# Altium footprint library altera-stratix-iv.PCBLIB: 5 footprints (part 4 of 4)
Each footprint in its own frame and in the unit in brackets; x right, y up, seen from the top. Pads: shape width x height; smd on the part's side, far side on the other; paste and mask are expansions set on the pad; w line width, h text height; cw(c..) or ccw(c..) is an arc to the next point about the centre after c.
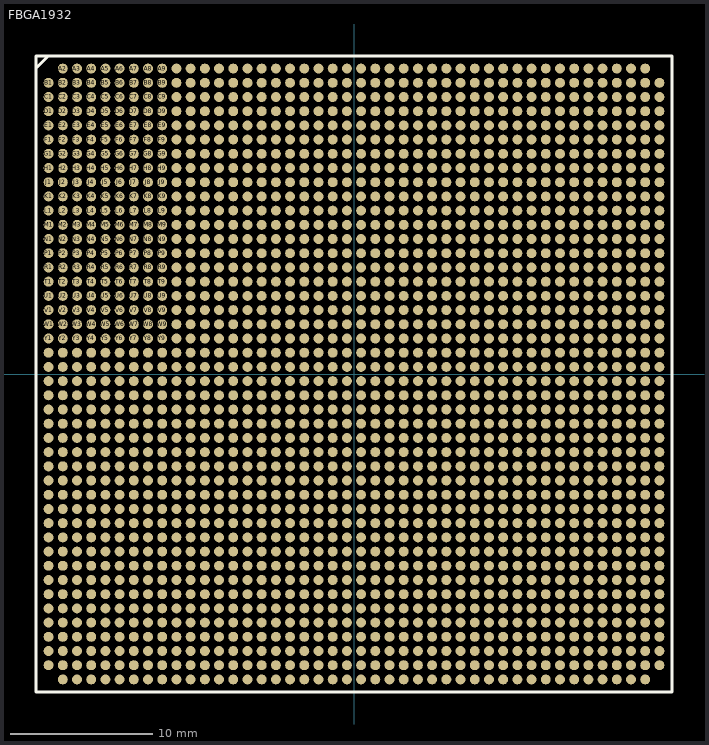
[diagram p3: the footprint, top view; thin cyan lines are the x and y axes]

## FBGA1932 [mil]
pads (1932):
  rrect100% 27.56x27.56 smd: A2(-807.09,846.46) A3(-767.72,846.46) A4(-728.35,846.46) A5(-688.98,846.46) A6(-649.61,846.46) A7(-610.24,846.46) A8(-570.87,846.46) A9(-531.5,846.46) A10(-492.13,846.46) A11(-452.76,846.46) A12(-413.39,846.46) A13(-374.02,846.46) A14(-334.65,846.46) A15(-295.28,846.46) A16(-255.91,846.46) A17(-216.54,846.46) A18(-177.17,846.46) A19(-137.8,846.46) A20(-98.43,846.46) A21(-59.06,846.46) A22(-19.69,846.46) A23(19.69,846.46) A24(59.06,846.46) A25(98.43,846.46) A26(137.8,846.46) A27(177.17,846.46) A28(216.54,846.46) A29(255.91,846.46) A30(295.28,846.46) A31(334.65,846.46) A32(374.02,846.46) A33(413.39,846.46) A34(452.76,846.46) A35(492.13,846.46) A36(531.5,846.46) A37(570.87,846.46) A38(610.24,846.46) A39(649.61,846.46) A40(688.98,846.46) A41(728.35,846.46) A42(767.72,846.46) A43(807.09,846.46) AA1(-846.46,59.06) AA2(-807.09,59.06) AA3(-767.72,59.06) AA4(-728.35,59.06) AA5(-688.98,59.06) AA6(-649.61,59.06) AA7(-610.24,59.06) AA8(-570.87,59.06) AA9(-531.5,59.06) AA10(-492.13,59.06) AA11(-452.76,59.06) AA12(-413.39,59.06) AA13(-374.02,59.06) AA14(-334.65,59.06) AA15(-295.28,59.06) AA16(-255.91,59.06) AA17(-216.54,59.06) AA18(-177.17,59.06) AA19(-137.8,59.06) AA20(-98.43,59.06) AA21(-59.06,59.06) AA22(-19.69,59.06) AA23(19.69,59.06) AA24(59.06,59.06) AA25(98.43,59.06) AA26(137.8,59.06) AA27(177.17,59.06) AA28(216.54,59.06) AA29(255.91,59.06) AA30(295.28,59.06) AA31(334.65,59.06) AA32(374.02,59.06) AA33(413.39,59.06) AA34(452.76,59.06) AA35(492.13,59.06) AA36(531.5,59.06) AA37(570.87,59.06) AA38(610.24,59.06) AA39(649.61,59.06) AA40(688.98,59.06) AA41(728.35,59.06) AA42(767.72,59.06) AA43(807.09,59.06) AA44(846.46,59.06) AB1(-846.46,19.69) AB2(-807.09,19.69) AB3(-767.72,19.69) AB4(-728.35,19.69) AB5(-688.98,19.69) AB6(-649.61,19.69) AB7(-610.24,19.69) AB8(-570.87,19.69) AB9(-531.5,19.69) AB10(-492.13,19.69) AB11(-452.76,19.69) AB12(-413.39,19.69) AB13(-374.02,19.69) AB14(-334.65,19.69) AB15(-295.28,19.69) AB16(-255.91,19.69) AB17(-216.54,19.69) AB18(-177.17,19.69) AB19(-137.8,19.69) AB20(-98.43,19.69) AB21(-59.06,19.69) AB22(-19.69,19.69) AB23(19.69,19.69) AB24(59.06,19.69) AB25(98.43,19.69) AB26(137.8,19.69) AB27(177.17,19.69) AB28(216.54,19.69) AB29(255.91,19.69) AB30(295.28,19.69) AB31(334.65,19.69) AB32(374.02,19.69) AB33(413.39,19.69) AB34(452.76,19.69) AB35(492.13,19.69) AB36(531.5,19.69) AB37(570.87,19.69) AB38(610.24,19.69) AB39(649.61,19.69) AB40(688.98,19.69) AB41(728.35,19.69) AB42(767.72,19.69) AB43(807.09,19.69) AB44(846.46,19.69) AC1(-846.46,-19.69) AC2(-807.09,-19.69) AC3(-767.72,-19.69) AC4(-728.35,-19.69) AC5(-688.98,-19.69) AC6(-649.61,-19.69) AC7(-610.24,-19.69) AC8(-570.87,-19.69) AC9(-531.5,-19.69) AC10(-492.13,-19.69) AC11(-452.76,-19.69) AC12(-413.39,-19.69) AC13(-374.02,-19.69) AC14(-334.65,-19.69) AC15(-295.28,-19.69) AC16(-255.91,-19.69) AC17(-216.54,-19.69) AC18(-177.17,-19.69) AC19(-137.8,-19.69) AC20(-98.43,-19.69) AC21(-59.06,-19.69) AC22(-19.69,-19.69) AC23(19.69,-19.69) AC24(59.06,-19.69) AC25(98.43,-19.69) AC26(137.8,-19.69) AC27(177.17,-19.69) AC28(216.54,-19.69) AC29(255.91,-19.69) AC30(295.28,-19.69) AC31(334.65,-19.69) AC32(374.02,-19.69) AC33(413.39,-19.69) AC34(452.76,-19.69) AC35(492.13,-19.69) AC36(531.5,-19.69) AC37(570.87,-19.69) AC38(610.24,-19.69) AC39(649.61,-19.69) AC40(688.98,-19.69) AC41(728.35,-19.69) AC42(767.72,-19.69) AC43(807.09,-19.69) AC44(846.46,-19.69) AD1(-846.46,-59.06) AD2(-807.09,-59.06) AD3(-767.72,-59.06) AD4(-728.35,-59.06) AD5(-688.98,-59.06) AD6(-649.61,-59.06) AD7(-610.24,-59.06) AD8(-570.87,-59.06) AD9(-531.5,-59.06) AD10(-492.13,-59.06) AD11(-452.76,-59.06) AD12(-413.39,-59.06) AD13(-374.02,-59.06) AD14(-334.65,-59.06) AD15(-295.28,-59.06) AD16(-255.91,-59.06) AD17(-216.54,-59.06) AD18(-177.17,-59.06) AD19(-137.8,-59.06) AD20(-98.43,-59.06) AD21(-59.06,-59.06) AD22(-19.69,-59.06) AD23(19.69,-59.06) AD24(59.06,-59.06) AD25(98.43,-59.06) AD26(137.8,-59.06) AD27(177.17,-59.06) AD28(216.54,-59.06) AD29(255.91,-59.06) AD30(295.28,-59.06) AD31(334.65,-59.06) AD32(374.02,-59.06) AD33(413.39,-59.06) AD34(452.76,-59.06) AD35(492.13,-59.06) AD36(531.5,-59.06) AD37(570.87,-59.06) AD38(610.24,-59.06) AD39(649.61,-59.06) AD40(688.98,-59.06) AD41(728.35,-59.06) AD42(767.72,-59.06) AD43(807.09,-59.06) AD44(846.46,-59.06) AE1(-846.46,-98.43) AE2(-807.09,-98.43) AE3(-767.72,-98.43) AE4(-728.35,-98.43) AE5(-688.98,-98.43) AE6(-649.61,-98.43) AE7(-610.24,-98.43) AE8(-570.87,-98.43) AE9(-531.5,-98.43) AE10(-492.13,-98.43) AE11(-452.76,-98.43) AE12(-413.39,-98.43) AE13(-374.02,-98.43) AE14(-334.65,-98.43) AE15(-295.28,-98.43) AE16(-255.91,-98.43) AE17(-216.54,-98.43) AE18(-177.17,-98.43) AE19(-137.8,-98.43) AE20(-98.43,-98.43) AE21(-59.06,-98.43) AE22(-19.69,-98.43) AE23(19.69,-98.43) AE24(59.06,-98.43) AE25(98.43,-98.43) AE26(137.8,-98.43) AE27(177.17,-98.43) AE28(216.54,-98.43) AE29(255.91,-98.43) AE30(295.28,-98.43) AE31(334.65,-98.43) AE32(374.02,-98.43) AE33(413.39,-98.43) AE34(452.76,-98.43) AE35(492.13,-98.43) AE36(531.5,-98.43) AE37(570.87,-98.43) AE38(610.24,-98.43) AE39(649.61,-98.43) AE40(688.98,-98.43) AE41(728.35,-98.43) AE42(767.72,-98.43) AE43(807.09,-98.43) AE44(846.46,-98.43) AF1(-846.46,-137.8) AF2(-807.09,-137.8) AF3(-767.72,-137.8) AF4(-728.35,-137.8) AF5(-688.98,-137.8) AF6(-649.61,-137.8) AF7(-610.24,-137.8) AF8(-570.87,-137.8) AF9(-531.5,-137.8) AF10(-492.13,-137.8) AF11(-452.76,-137.8) AF12(-413.39,-137.8) AF13(-374.02,-137.8) AF14(-334.65,-137.8) AF15(-295.28,-137.8) AF16(-255.91,-137.8) AF17(-216.54,-137.8) AF18(-177.17,-137.8) AF19(-137.8,-137.8) AF20(-98.43,-137.8) AF21(-59.06,-137.8) AF22(-19.69,-137.8) AF23(19.69,-137.8) AF24(59.06,-137.8) AF25(98.43,-137.8) AF26(137.8,-137.8) AF27(177.17,-137.8) AF28(216.54,-137.8) AF29(255.91,-137.8) AF30(295.28,-137.8) AF31(334.65,-137.8) AF32(374.02,-137.8) AF33(413.39,-137.8) AF34(452.76,-137.8) AF35(492.13,-137.8) AF36(531.5,-137.8) AF37(570.87,-137.8) AF38(610.24,-137.8) AF39(649.61,-137.8) AF40(688.98,-137.8) AF41(728.35,-137.8) AF42(767.72,-137.8) AF43(807.09,-137.8) AF44(846.46,-137.8) AG1(-846.46,-177.17) AG2(-807.09,-177.17) AG3(-767.72,-177.17) AG4(-728.35,-177.17) AG5(-688.98,-177.17) AG6(-649.61,-177.17) AG7(-610.24,-177.17) AG8(-570.87,-177.17) AG9(-531.5,-177.17) AG10(-492.13,-177.17) AG11(-452.76,-177.17) AG12(-413.39,-177.17) AG13(-374.02,-177.17) AG14(-334.65,-177.17) AG15(-295.28,-177.17) AG16(-255.91,-177.17) AG17(-216.54,-177.17) AG18(-177.17,-177.17) AG19(-137.8,-177.17) AG20(-98.43,-177.17) AG21(-59.06,-177.17) AG22(-19.69,-177.17) AG23(19.69,-177.17) AG24(59.06,-177.17) AG25(98.43,-177.17) AG26(137.8,-177.17) AG27(177.17,-177.17) AG28(216.54,-177.17) AG29(255.91,-177.17) AG30(295.28,-177.17) AG31(334.65,-177.17) AG32(374.02,-177.17) AG33(413.39,-177.17) AG34(452.76,-177.17) AG35(492.13,-177.17) AG36(531.5,-177.17) AG37(570.87,-177.17) AG38(610.24,-177.17) AG39(649.61,-177.17) AG40(688.98,-177.17) AG41(728.35,-177.17) AG42(767.72,-177.17) AG43(807.09,-177.17) AG44(846.46,-177.17) AH1(-846.46,-216.54) AH2(-807.09,-216.54) AH3(-767.72,-216.54) AH4(-728.35,-216.54) AH5(-688.98,-216.54) AH6(-649.61,-216.54) AH7(-610.24,-216.54) AH8(-570.87,-216.54) AH9(-531.5,-216.54) AH10(-492.13,-216.54) AH11(-452.76,-216.54) AH12(-413.39,-216.54) AH13(-374.02,-216.54) AH14(-334.65,-216.54) AH15(-295.28,-216.54) AH16(-255.91,-216.54) AH17(-216.54,-216.54) AH18(-177.17,-216.54) AH19(-137.8,-216.54) AH20(-98.43,-216.54) AH21(-59.06,-216.54) AH22(-19.69,-216.54) AH23(19.69,-216.54) AH24(59.06,-216.54) AH25(98.43,-216.54) AH26(137.8,-216.54) AH27(177.17,-216.54) AH28(216.54,-216.54) AH29(255.91,-216.54) AH30(295.28,-216.54) AH31(334.65,-216.54) AH32(374.02,-216.54) AH33(413.39,-216.54) AH34(452.76,-216.54) AH35(492.13,-216.54) AH36(531.5,-216.54) AH37(570.87,-216.54) AH38(610.24,-216.54) AH39(649.61,-216.54) AH40(688.98,-216.54) AH41(728.35,-216.54) AH42(767.72,-216.54) AH43(807.09,-216.54) AH44(846.46,-216.54) AJ1(-846.46,-255.91) AJ2(-807.09,-255.91) AJ3(-767.72,-255.91) AJ4(-728.35,-255.91) AJ5(-688.98,-255.91) AJ6(-649.61,-255.91) AJ7(-610.24,-255.91) AJ8(-570.87,-255.91) AJ9(-531.5,-255.91) AJ10(-492.13,-255.91) AJ11(-452.76,-255.91) AJ12(-413.39,-255.91) AJ13(-374.02,-255.91) AJ14(-334.65,-255.91) AJ15(-295.28,-255.91) AJ16(-255.91,-255.91) AJ17(-216.54,-255.91) AJ18(-177.17,-255.91) AJ19(-137.8,-255.91) AJ20(-98.43,-255.91) AJ21(-59.06,-255.91) AJ22(-19.69,-255.91) AJ23(19.69,-255.91) AJ24(59.06,-255.91) AJ25(98.43,-255.91) AJ26(137.8,-255.91) AJ27(177.17,-255.91) AJ28(216.54,-255.91) AJ29(255.91,-255.91) AJ30(295.28,-255.91) AJ31(334.65,-255.91) AJ32(374.02,-255.91) AJ33(413.39,-255.91) AJ34(452.76,-255.91) AJ35(492.13,-255.91) AJ36(531.5,-255.91) AJ37(570.87,-255.91) AJ38(610.24,-255.91) AJ39(649.61,-255.91) AJ40(688.98,-255.91) AJ41(728.35,-255.91) AJ42(767.72,-255.91) AJ43(807.09,-255.91) AJ44(846.46,-255.91) AK1(-846.46,-295.28) AK2(-807.09,-295.28) AK3(-767.72,-295.28) AK4(-728.35,-295.28) AK5(-688.98,-295.28) AK6(-649.61,-295.28) AK7(-610.24,-295.28) AK8(-570.87,-295.28) AK9(-531.5,-295.28) AK10(-492.13,-295.28) AK11(-452.76,-295.28) AK12(-413.39,-295.28) AK13(-374.02,-295.28) AK14(-334.65,-295.28) AK15(-295.28,-295.28) AK16(-255.91,-295.28) AK17(-216.54,-295.28) AK18(-177.17,-295.28) AK19(-137.8,-295.28) AK20(-98.43,-295.28) AK21(-59.06,-295.28) AK22(-19.69,-295.28) AK23(19.69,-295.28) AK24(59.06,-295.28) AK25(98.43,-295.28) AK26(137.8,-295.28) AK27(177.17,-295.28) AK28(216.54,-295.28) AK29(255.91,-295.28) AK30(295.28,-295.28) AK31(334.65,-295.28) AK32(374.02,-295.28) AK33(413.39,-295.28) AK34(452.76,-295.28) AK35(492.13,-295.28) AK36(531.5,-295.28) AK37(570.87,-295.28) AK38(610.24,-295.28) AK39(649.61,-295.28) AK40(688.98,-295.28) AK41(728.35,-295.28) AK42(767.72,-295.28) AK43(807.09,-295.28) AK44(846.46,-295.28) AL1(-846.46,-334.65) AL2(-807.09,-334.65) AL3(-767.72,-334.65) AL4(-728.35,-334.65) AL5(-688.98,-334.65) AL6(-649.61,-334.65) AL7(-610.24,-334.65) AL8(-570.87,-334.65) AL9(-531.5,-334.65) AL10(-492.13,-334.65) AL11(-452.76,-334.65) AL12(-413.39,-334.65) AL13(-374.02,-334.65) AL14(-334.65,-334.65) AL15(-295.28,-334.65) AL16(-255.91,-334.65) AL17(-216.54,-334.65) AL18(-177.17,-334.65) AL19(-137.8,-334.65) AL20(-98.43,-334.65) AL21(-59.06,-334.65) AL22(-19.69,-334.65) AL23(19.69,-334.65) AL24(59.06,-334.65) AL25(98.43,-334.65) AL26(137.8,-334.65) AL27(177.17,-334.65) AL28(216.54,-334.65) AL29(255.91,-334.65) AL30(295.28,-334.65) AL31(334.65,-334.65) AL32(374.02,-334.65) AL33(413.39,-334.65) AL34(452.76,-334.65) AL35(492.13,-334.65) AL36(531.5,-334.65) AL37(570.87,-334.65) AL38(610.24,-334.65) AL39(649.61,-334.65) AL40(688.98,-334.65) AL41(728.35,-334.65) AL42(767.72,-334.65) AL43(807.09,-334.65) AL44(846.46,-334.65) AM1(-846.46,-374.02) AM2(-807.09,-374.02) AM3(-767.72,-374.02) AM4(-728.35,-374.02) AM5(-688.98,-374.02) AM6(-649.61,-374.02) AM7(-610.24,-374.02) AM8(-570.87,-374.02) AM9(-531.5,-374.02) AM10(-492.13,-374.02) AM11(-452.76,-374.02) AM12(-413.39,-374.02) AM13(-374.02,-374.02) AM14(-334.65,-374.02) AM15(-295.28,-374.02) AM16(-255.91,-374.02) AM17(-216.54,-374.02) AM18(-177.17,-374.02) AM19(-137.8,-374.02) AM20(-98.43,-374.02) AM21(-59.06,-374.02) AM22(-19.69,-374.02) AM23(19.69,-374.02) AM24(59.06,-374.02) AM25(98.43,-374.02) AM26(137.8,-374.02) AM27(177.17,-374.02) AM28(216.54,-374.02) AM29(255.91,-374.02) AM30(295.28,-374.02) AM31(334.65,-374.02) AM32(374.02,-374.02) AM33(413.39,-374.02) AM34(452.76,-374.02) AM35(492.13,-374.02) AM36(531.5,-374.02) AM37(570.87,-374.02) AM38(610.24,-374.02) AM39(649.61,-374.02) AM40(688.98,-374.02) AM41(728.35,-374.02) AM42(767.72,-374.02) AM43(807.09,-374.02) AM44(846.46,-374.02) AN1(-846.46,-413.39) AN2(-807.09,-413.39) AN3(-767.72,-413.39) AN4(-728.35,-413.39) AN5(-688.98,-413.39) AN6(-649.61,-413.39) AN7(-610.24,-413.39) AN8(-570.87,-413.39) AN9(-531.5,-413.39) AN10(-492.13,-413.39) AN11(-452.76,-413.39) AN12(-413.39,-413.39) AN13(-374.02,-413.39) AN14(-334.65,-413.39) AN15(-295.28,-413.39) AN16(-255.91,-413.39) AN17(-216.54,-413.39) AN18(-177.17,-413.39) AN19(-137.8,-413.39) AN20(-98.43,-413.39) AN21(-59.06,-413.39) AN22(-19.69,-413.39) AN23(19.69,-413.39) AN24(59.06,-413.39) AN25(98.43,-413.39) AN26(137.8,-413.39) AN27(177.17,-413.39) AN28(216.54,-413.39) AN29(255.91,-413.39) AN30(295.28,-413.39) AN31(334.65,-413.39) AN32(374.02,-413.39) AN33(413.39,-413.39) AN34(452.76,-413.39) AN35(492.13,-413.39) AN36(531.5,-413.39) AN37(570.87,-413.39) AN38(610.24,-413.39) AN39(649.61,-413.39) AN40(688.98,-413.39) AN41(728.35,-413.39) AN42(767.72,-413.39) AN43(807.09,-413.39) AN44(846.46,-413.39) AP1(-846.46,-452.76) AP2(-807.09,-452.76) AP3(-767.72,-452.76) AP4(-728.35,-452.76) AP5(-688.98,-452.76) AP6(-649.61,-452.76) AP7(-610.24,-452.76) AP8(-570.87,-452.76) AP9(-531.5,-452.76) AP10(-492.13,-452.76) AP11(-452.76,-452.76) AP12(-413.39,-452.76) AP13(-374.02,-452.76) AP14(-334.65,-452.76) AP15(-295.28,-452.76) AP16(-255.91,-452.76) AP17(-216.54,-452.76) AP18(-177.17,-452.76) AP19(-137.8,-452.76) AP20(-98.43,-452.76) AP21(-59.06,-452.76) AP22(-19.69,-452.76) AP23(19.69,-452.76) AP24(59.06,-452.76) AP25(98.43,-452.76) AP26(137.8,-452.76) AP27(177.17,-452.76) AP28(216.54,-452.76) AP29(255.91,-452.76) AP30(295.28,-452.76) AP31(334.65,-452.76) AP32(374.02,-452.76) AP33(413.39,-452.76) AP34(452.76,-452.76) AP35(492.13,-452.76) AP36(531.5,-452.76) AP37(570.87,-452.76) AP38(610.24,-452.76) AP39(649.61,-452.76) AP40(688.98,-452.76) AP41(728.35,-452.76) AP42(767.72,-452.76) AP43(807.09,-452.76) AP44(846.46,-452.76) AR1(-846.46,-492.13) AR2(-807.09,-492.13) AR3(-767.72,-492.13) AR4(-728.35,-492.13) AR5(-688.98,-492.13) AR6(-649.61,-492.13) AR7(-610.24,-492.13) AR8(-570.87,-492.13) AR9(-531.5,-492.13) AR10(-492.13,-492.13) AR11(-452.76,-492.13) AR12(-413.39,-492.13) AR13(-374.02,-492.13) AR14(-334.65,-492.13) AR15(-295.28,-492.13) AR16(-255.91,-492.13) AR17(-216.54,-492.13) AR18(-177.17,-492.13) AR19(-137.8,-492.13) AR20(-98.43,-492.13) AR21(-59.06,-492.13) AR22(-19.69,-492.13) AR23(19.69,-492.13) AR24(59.06,-492.13) AR25(98.43,-492.13) AR26(137.8,-492.13) AR27(177.17,-492.13) AR28(216.54,-492.13) AR29(255.91,-492.13) AR30(295.28,-492.13) AR31(334.65,-492.13) AR32(374.02,-492.13) AR33(413.39,-492.13) AR34(452.76,-492.13) AR35(492.13,-492.13) AR36(531.5,-492.13) AR37(570.87,-492.13) AR38(610.24,-492.13) AR39(649.61,-492.13) AR40(688.98,-492.13) AR41(728.35,-492.13) AR42(767.72,-492.13) AR43(807.09,-492.13) AR44(846.46,-492.13) AT1(-846.46,-531.5) AT2(-807.09,-531.5) AT3(-767.72,-531.5) AT4(-728.35,-531.5) AT5(-688.98,-531.5) AT6(-649.61,-531.5) AT7(-610.24,-531.5) AT8(-570.87,-531.5) AT9(-531.5,-531.5) AT10(-492.13,-531.5) AT11(-452.76,-531.5) AT12(-413.39,-531.5) AT13(-374.02,-531.5) AT14(-334.65,-531.5) AT15(-295.28,-531.5) AT16(-255.91,-531.5) AT17(-216.54,-531.5) AT18(-177.17,-531.5) AT19(-137.8,-531.5) AT20(-98.43,-531.5) AT21(-59.06,-531.5) AT22(-19.69,-531.5) AT23(19.69,-531.5) AT24(59.06,-531.5) AT25(98.43,-531.5) AT26(137.8,-531.5) AT27(177.17,-531.5) AT28(216.54,-531.5) AT29(255.91,-531.5) AT30(295.28,-531.5) AT31(334.65,-531.5) AT32(374.02,-531.5) AT33(413.39,-531.5) AT34(452.76,-531.5) AT35(492.13,-531.5) AT36(531.5,-531.5) AT37(570.87,-531.5) AT38(610.24,-531.5) AT39(649.61,-531.5) AT40(688.98,-531.5) AT41(728.35,-531.5) AT42(767.72,-531.5) AT43(807.09,-531.5) AT44(846.46,-531.5) AU1(-846.46,-570.87) AU2(-807.09,-570.87) AU3(-767.72,-570.87) AU4(-728.35,-570.87) AU5(-688.98,-570.87) AU6(-649.61,-570.87) AU7(-610.24,-570.87) AU8(-570.87,-570.87) AU9(-531.5,-570.87) AU10(-492.13,-570.87) AU11(-452.76,-570.87) AU12(-413.39,-570.87) AU13(-374.02,-570.87) AU14(-334.65,-570.87) AU15(-295.28,-570.87) AU16(-255.91,-570.87) AU17(-216.54,-570.87) AU18(-177.17,-570.87) AU19(-137.8,-570.87) AU20(-98.43,-570.87) AU21(-59.06,-570.87) AU22(-19.69,-570.87) AU23(19.69,-570.87) AU24(59.06,-570.87) AU25(98.43,-570.87) AU26(137.8,-570.87) AU27(177.17,-570.87) AU28(216.54,-570.87) AU29(255.91,-570.87) AU30(295.28,-570.87) AU31(334.65,-570.87) AU32(374.02,-570.87) AU33(413.39,-570.87) AU34(452.76,-570.87) AU35(492.13,-570.87) AU36(531.5,-570.87) AU37(570.87,-570.87) AU38(610.24,-570.87) AU39(649.61,-570.87) AU40(688.98,-570.87) AU41(728.35,-570.87) AU42(767.72,-570.87) AU43(807.09,-570.87) AU44(846.46,-570.87) AV1(-846.46,-610.24) AV2(-807.09,-610.24) AV3(-767.72,-610.24) AV4(-728.35,-610.24) AV5(-688.98,-610.24) AV6(-649.61,-610.24) AV7(-610.24,-610.24) AV8(-570.87,-610.24) AV9(-531.5,-610.24) AV10(-492.13,-610.24) AV11(-452.76,-610.24) AV12(-413.39,-610.24) AV13(-374.02,-610.24) AV14(-334.65,-610.24) AV15(-295.28,-610.24) AV16(-255.91,-610.24) AV17(-216.54,-610.24) AV18(-177.17,-610.24) AV19(-137.8,-610.24) AV20(-98.43,-610.24) AV21(-59.06,-610.24) AV22(-19.69,-610.24) AV23(19.69,-610.24) AV24(59.06,-610.24) AV25(98.43,-610.24) AV26(137.8,-610.24) AV27(177.17,-610.24) AV28(216.54,-610.24) AV29(255.91,-610.24) AV30(295.28,-610.24) AV31(334.65,-610.24) AV32(374.02,-610.24) AV33(413.39,-610.24) AV34(452.76,-610.24) AV35(492.13,-610.24) AV36(531.5,-610.24) AV37(570.87,-610.24) AV38(610.24,-610.24) AV39(649.61,-610.24) AV40(688.98,-610.24) AV41(728.35,-610.24) AV42(767.72,-610.24) AV43(807.09,-610.24) AV44(846.46,-610.24) AW1(-846.46,-649.61) AW2(-807.09,-649.61) AW3(-767.72,-649.61) AW4(-728.35,-649.61) AW5(-688.98,-649.61) AW6(-649.61,-649.61) AW7(-610.24,-649.61) AW8(-570.87,-649.61) AW9(-531.5,-649.61) AW10(-492.13,-649.61) AW11(-452.76,-649.61) AW12(-413.39,-649.61) AW13(-374.02,-649.61) AW14(-334.65,-649.61) AW15(-295.28,-649.61) AW16(-255.91,-649.61) AW17(-216.54,-649.61) AW18(-177.17,-649.61) AW19(-137.8,-649.61) AW20(-98.43,-649.61) AW21(-59.06,-649.61) AW22(-19.69,-649.61) AW23(19.69,-649.61) AW24(59.06,-649.61) AW25(98.43,-649.61) AW26(137.8,-649.61) AW27(177.17,-649.61) AW28(216.54,-649.61) AW29(255.91,-649.61) AW30(295.28,-649.61) AW31(334.65,-649.61) AW32(374.02,-649.61) AW33(413.39,-649.61) AW34(452.76,-649.61) AW35(492.13,-649.61) AW36(531.5,-649.61) AW37(570.87,-649.61) AW38(610.24,-649.61) AW39(649.61,-649.61) AW40(688.98,-649.61) AW41(728.35,-649.61) AW42(767.72,-649.61) AW43(807.09,-649.61) AW44(846.46,-649.61) AY1(-846.46,-688.98) AY2(-807.09,-688.98) AY3(-767.72,-688.98) AY4(-728.35,-688.98) AY5(-688.98,-688.98) AY6(-649.61,-688.98) AY7(-610.24,-688.98) AY8(-570.87,-688.98) AY9(-531.5,-688.98) AY10(-492.13,-688.98) AY11(-452.76,-688.98) AY12(-413.39,-688.98) AY13(-374.02,-688.98) AY14(-334.65,-688.98) AY15(-295.28,-688.98) AY16(-255.91,-688.98) AY17(-216.54,-688.98) AY18(-177.17,-688.98) AY19(-137.8,-688.98) AY20(-98.43,-688.98) AY21(-59.06,-688.98) AY22(-19.69,-688.98) AY23(19.69,-688.98) AY24(59.06,-688.98) AY25(98.43,-688.98) AY26(137.8,-688.98) AY27(177.17,-688.98) AY28(216.54,-688.98) AY29(255.91,-688.98) AY30(295.28,-688.98) AY31(334.65,-688.98) AY32(374.02,-688.98) AY33(413.39,-688.98) AY34(452.76,-688.98) AY35(492.13,-688.98) AY36(531.5,-688.98) AY37(570.87,-688.98) AY38(610.24,-688.98) AY39(649.61,-688.98) AY40(688.98,-688.98) AY41(728.35,-688.98) AY42(767.72,-688.98) AY43(807.09,-688.98) AY44(846.46,-688.98) B1(-846.46,807.09) B2(-807.09,807.09) B3(-767.72,807.09) B4(-728.35,807.09) B5(-688.98,807.09) B6(-649.61,807.09) B7(-610.24,807.09) B8(-570.87,807.09) B9(-531.5,807.09) B10(-492.13,807.09) B11(-452.76,807.09) B12(-413.39,807.09) B13(-374.02,807.09) B14(-334.65,807.09) B15(-295.28,807.09) B16(-255.91,807.09) B17(-216.54,807.09) B18(-177.17,807.09) B19(-137.8,807.09) B20(-98.43,807.09) B21(-59.06,807.09) B22(-19.69,807.09) B23(19.69,807.09) B24(59.06,807.09) B25(98.43,807.09) B26(137.8,807.09) B27(177.17,807.09) B28(216.54,807.09) B29(255.91,807.09) B30(295.28,807.09) B31(334.65,807.09) B32(374.02,807.09) B33(413.39,807.09) B34(452.76,807.09) B35(492.13,807.09) B36(531.5,807.09) B37(570.87,807.09) B38(610.24,807.09) B39(649.61,807.09) B40(688.98,807.09) B41(728.35,807.09) B42(767.72,807.09) B43(807.09,807.09) B44(846.46,807.09) BA1(-846.46,-728.35) BA2(-807.09,-728.35) BA3(-767.72,-728.35) BA4(-728.35,-728.35) BA5(-688.98,-728.35) BA6(-649.61,-728.35) BA7(-610.24,-728.35) BA8(-570.87,-728.35) BA9(-531.5,-728.35) BA10(-492.13,-728.35) BA11(-452.76,-728.35) BA12(-413.39,-728.35) BA13(-374.02,-728.35) BA14(-334.65,-728.35) BA15(-295.28,-728.35) BA16(-255.91,-728.35) BA17(-216.54,-728.35) BA18(-177.17,-728.35) BA19(-137.8,-728.35) BA20(-98.43,-728.35) BA21(-59.06,-728.35) BA22(-19.69,-728.35) BA23(19.69,-728.35) BA24(59.06,-728.35) BA25(98.43,-728.35) BA26(137.8,-728.35) BA27(177.17,-728.35) BA28(216.54,-728.35) BA29(255.91,-728.35) BA30(295.28,-728.35) BA31(334.65,-728.35) BA32(374.02,-728.35) BA33(413.39,-728.35) BA34(452.76,-728.35) BA35(492.13,-728.35) BA36(531.5,-728.35) BA37(570.87,-728.35) BA38(610.24,-728.35) BA39(649.61,-728.35) BA40(688.98,-728.35) BA41(728.35,-728.35) BA42(767.72,-728.35) BA43(807.09,-728.35) BA44(846.46,-728.35) BB1(-846.46,-767.72) BB2(-807.09,-767.72) BB3(-767.72,-767.72) BB4(-728.35,-767.72) BB5(-688.98,-767.72) BB6(-649.61,-767.72) BB7(-610.24,-767.72) BB8(-570.87,-767.72) BB9(-531.5,-767.72) BB10(-492.13,-767.72) BB11(-452.76,-767.72) BB12(-413.39,-767.72) BB13(-374.02,-767.72) BB14(-334.65,-767.72) BB15(-295.28,-767.72) BB16(-255.91,-767.72) BB17(-216.54,-767.72) BB18(-177.17,-767.72) BB19(-137.8,-767.72) BB20(-98.43,-767.72) BB21(-59.06,-767.72) BB22(-19.69,-767.72) BB23(19.69,-767.72) BB24(59.06,-767.72) BB25(98.43,-767.72) BB26(137.8,-767.72) BB27(177.17,-767.72) BB28(216.54,-767.72) BB29(255.91,-767.72) BB30(295.28,-767.72) BB31(334.65,-767.72) BB32(374.02,-767.72) BB33(413.39,-767.72) BB34(452.76,-767.72) BB35(492.13,-767.72) BB36(531.5,-767.72) BB37(570.87,-767.72) BB38(610.24,-767.72) BB39(649.61,-767.72) BB40(688.98,-767.72) BB41(728.35,-767.72) BB42(767.72,-767.72) BB43(807.09,-767.72) BB44(846.46,-767.72) BC1(-846.46,-807.09) BC2(-807.09,-807.09) BC3(-767.72,-807.09) BC4(-728.35,-807.09) BC5(-688.98,-807.09) BC6(-649.61,-807.09) BC7(-610.24,-807.09) BC8(-570.87,-807.09) BC9(-531.5,-807.09) BC10(-492.13,-807.09) BC11(-452.76,-807.09) BC12(-413.39,-807.09) BC13(-374.02,-807.09) BC14(-334.65,-807.09) BC15(-295.28,-807.09) BC16(-255.91,-807.09) BC17(-216.54,-807.09) BC18(-177.17,-807.09) BC19(-137.8,-807.09) BC20(-98.43,-807.09) BC21(-59.06,-807.09) BC22(-19.69,-807.09) BC23(19.69,-807.09) BC24(59.06,-807.09) BC25(98.43,-807.09) BC26(137.8,-807.09) BC27(177.17,-807.09) BC28(216.54,-807.09) BC29(255.91,-807.09) BC30(295.28,-807.09) BC31(334.65,-807.09) BC32(374.02,-807.09) BC33(413.39,-807.09) BC34(452.76,-807.09) BC35(492.13,-807.09) BC36(531.5,-807.09) BC37(570.87,-807.09) BC38(610.24,-807.09) BC39(649.61,-807.09) BC40(688.98,-807.09) BC41(728.35,-807.09) BC42(767.72,-807.09) BC43(807.09,-807.09) BC44(846.46,-807.09) BD2(-807.09,-846.46) BD3(-767.72,-846.46) BD4(-728.35,-846.46) BD5(-688.98,-846.46) BD6(-649.61,-846.46) BD7(-610.24,-846.46) BD8(-570.87,-846.46) BD9(-531.5,-846.46) BD10(-492.13,-846.46) BD11(-452.76,-846.46) BD12(-413.39,-846.46) BD13(-374.02,-846.46) BD14(-334.65,-846.46) BD15(-295.28,-846.46) BD16(-255.91,-846.46) BD17(-216.54,-846.46) BD18(-177.17,-846.46) BD19(-137.8,-846.46) BD20(-98.43,-846.46) BD21(-59.06,-846.46) BD22(-19.69,-846.46) BD23(19.69,-846.46) BD24(59.06,-846.46) BD25(98.43,-846.46) BD26(137.8,-846.46) BD27(177.17,-846.46) BD28(216.54,-846.46) BD29(255.91,-846.46) BD30(295.28,-846.46) BD31(334.65,-846.46) BD32(374.02,-846.46) BD33(413.39,-846.46) BD34(452.76,-846.46) BD35(492.13,-846.46) BD36(531.5,-846.46) BD37(570.87,-846.46) BD38(610.24,-846.46) BD39(649.61,-846.46) BD40(688.98,-846.46) BD41(728.35,-846.46) BD42(767.72,-846.46) BD43(807.09,-846.46) C1(-846.46,767.72) C2(-807.09,767.72) C3(-767.72,767.72) C4(-728.35,767.72) C5(-688.98,767.72) C6(-649.61,767.72) C7(-610.24,767.72) C8(-570.87,767.72) C9(-531.5,767.72) C10(-492.13,767.72) C11(-452.76,767.72) C12(-413.39,767.72) C13(-374.02,767.72) C14(-334.65,767.72) C15(-295.28,767.72) C16(-255.91,767.72) C17(-216.54,767.72) C18(-177.17,767.72) C19(-137.8,767.72) C20(-98.43,767.72) C21(-59.06,767.72) C22(-19.69,767.72) C23(19.69,767.72) C24(59.06,767.72) C25(98.43,767.72) C26(137.8,767.72) C27(177.17,767.72) C28(216.54,767.72) C29(255.91,767.72) C30(295.28,767.72) C31(334.65,767.72) C32(374.02,767.72) C33(413.39,767.72) C34(452.76,767.72) C35(492.13,767.72) C36(531.5,767.72) C37(570.87,767.72) C38(610.24,767.72) C39(649.61,767.72) C40(688.98,767.72) C41(728.35,767.72) C42(767.72,767.72) C43(807.09,767.72) C44(846.46,767.72) D1(-846.46,728.35) D2(-807.09,728.35) D3(-767.72,728.35) D4(-728.35,728.35) D5(-688.98,728.35) D6(-649.61,728.35) D7(-610.24,728.35) D8(-570.87,728.35) D9(-531.5,728.35) D10(-492.13,728.35) D11(-452.76,728.35) D12(-413.39,728.35) D13(-374.02,728.35) D14(-334.65,728.35) D15(-295.28,728.35) D16(-255.91,728.35) D17(-216.54,728.35) D18(-177.17,728.35) D19(-137.8,728.35) D20(-98.43,728.35) D21(-59.06,728.35) D22(-19.69,728.35) D23(19.69,728.35) D24(59.06,728.35) D25(98.43,728.35) D26(137.8,728.35) D27(177.17,728.35) D28(216.54,728.35) D29(255.91,728.35) D30(295.28,728.35) D31(334.65,728.35) D32(374.02,728.35) D33(413.39,728.35) D34(452.76,728.35) D35(492.13,728.35) D36(531.5,728.35) D37(570.87,728.35) D38(610.24,728.35) D39(649.61,728.35) D40(688.98,728.35) D41(728.35,728.35) D42(767.72,728.35) D43(807.09,728.35) D44(846.46,728.35) E1(-846.46,688.98) E2(-807.09,688.98) E3(-767.72,688.98) E4(-728.35,688.98) E5(-688.98,688.98) E6(-649.61,688.98) E7(-610.24,688.98) E8(-570.87,688.98) E9(-531.5,688.98) E10(-492.13,688.98) E11(-452.76,688.98) E12(-413.39,688.98) E13(-374.02,688.98) E14(-334.65,688.98) E15(-295.28,688.98) E16(-255.91,688.98) E17(-216.54,688.98) E18(-177.17,688.98) E19(-137.8,688.98) E20(-98.43,688.98) E21(-59.06,688.98) E22(-19.69,688.98) E23(19.69,688.98) E24(59.06,688.98) E25(98.43,688.98) E26(137.8,688.98) E27(177.17,688.98) E28(216.54,688.98) E29(255.91,688.98) E30(295.28,688.98) E31(334.65,688.98) E32(374.02,688.98) E33(413.39,688.98) E34(452.76,688.98) E35(492.13,688.98) E36(531.5,688.98) E37(570.87,688.98) E38(610.24,688.98) E39(649.61,688.98) E40(688.98,688.98) E41(728.35,688.98) E42(767.72,688.98) E43(807.09,688.98) E44(846.46,688.98) F1(-846.46,649.61) F2(-807.09,649.61) F3(-767.72,649.61) F4(-728.35,649.61) F5(-688.98,649.61) F6(-649.61,649.61) F7(-610.24,649.61) F8(-570.87,649.61) F9(-531.5,649.61) F10(-492.13,649.61) F11(-452.76,649.61) F12(-413.39,649.61) F13(-374.02,649.61) F14(-334.65,649.61) F15(-295.28,649.61) F16(-255.91,649.61) F17(-216.54,649.61) F18(-177.17,649.61) F19(-137.8,649.61) F20(-98.43,649.61) F21(-59.06,649.61) F22(-19.69,649.61) F23(19.69,649.61) F24(59.06,649.61) F25(98.43,649.61) F26(137.8,649.61) F27(177.17,649.61) F28(216.54,649.61) F29(255.91,649.61) F30(295.28,649.61) F31(334.65,649.61) F32(374.02,649.61) F33(413.39,649.61) F34(452.76,649.61) F35(492.13,649.61) F36(531.5,649.61) F37(570.87,649.61) F38(610.24,649.61) F39(649.61,649.61) F40(688.98,649.61) F41(728.35,649.61) F42(767.72,649.61) F43(807.09,649.61) F44(846.46,649.61) G1(-846.46,610.24) G2(-807.09,610.24) G3(-767.72,610.24) G4(-728.35,610.24) G5(-688.98,610.24) G6(-649.61,610.24) G7(-610.24,610.24) G8(-570.87,610.24) G9(-531.5,610.24) G10(-492.13,610.24) G11(-452.76,610.24) G12(-413.39,610.24) G13(-374.02,610.24) G14(-334.65,610.24) G15(-295.28,610.24) G16(-255.91,610.24) G17(-216.54,610.24) G18(-177.17,610.24) G19(-137.8,610.24) G20(-98.43,610.24) G21(-59.06,610.24) G22(-19.69,610.24) G23(19.69,610.24) G24(59.06,610.24) G25(98.43,610.24) G26(137.8,610.24) G27(177.17,610.24) G28(216.54,610.24) G29(255.91,610.24) G30(295.28,610.24) G31(334.65,610.24) G32(374.02,610.24) G33(413.39,610.24) G34(452.76,610.24) G35(492.13,610.24) G36(531.5,610.24) G37(570.87,610.24) G38(610.24,610.24) G39(649.61,610.24) G40(688.98,610.24) G41(728.35,610.24) G42(767.72,610.24) G43(807.09,610.24) G44(846.46,610.24) H1(-846.46,570.87) H2(-807.09,570.87) H3(-767.72,570.87) H4(-728.35,570.87) H5(-688.98,570.87) H6(-649.61,570.87) H7(-610.24,570.87) H8(-570.87,570.87) H9(-531.5,570.87) H10(-492.13,570.87) H11(-452.76,570.87) H12(-413.39,570.87) H13(-374.02,570.87) H14(-334.65,570.87) H15(-295.28,570.87) H16(-255.91,570.87) H17(-216.54,570.87) H18(-177.17,570.87) H19(-137.8,570.87) H20(-98.43,570.87) H21(-59.06,570.87) H22(-19.69,570.87) H23(19.69,570.87) H24(59.06,570.87) H25(98.43,570.87) H26(137.8,570.87) H27(177.17,570.87) H28(216.54,570.87) H29(255.91,570.87) H30(295.28,570.87) H31(334.65,570.87) H32(374.02,570.87) H33(413.39,570.87) H34(452.76,570.87) H35(492.13,570.87) H36(531.5,570.87) H37(570.87,570.87) H38(610.24,570.87) H39(649.61,570.87) H40(688.98,570.87) H41(728.35,570.87) H42(767.72,570.87) H43(807.09,570.87) H44(846.46,570.87) J1(-846.46,531.5) J2(-807.09,531.5) J3(-767.72,531.5) J4(-728.35,531.5) J5(-688.98,531.5) J6(-649.61,531.5) J7(-610.24,531.5) J8(-570.87,531.5) J9(-531.5,531.5) J10(-492.13,531.5) J11(-452.76,531.5) J12(-413.39,531.5) J13(-374.02,531.5) J14(-334.65,531.5) J15(-295.28,531.5) J16(-255.91,531.5) J17(-216.54,531.5) J18(-177.17,531.5) J19(-137.8,531.5) J20(-98.43,531.5) J21(-59.06,531.5) J22(-19.69,531.5) J23(19.69,531.5) J24(59.06,531.5) J25(98.43,531.5) J26(137.8,531.5) J27(177.17,531.5) J28(216.54,531.5) J29(255.91,531.5) J30(295.28,531.5) J31(334.65,531.5) J32(374.02,531.5) J33(413.39,531.5) J34(452.76,531.5) J35(492.13,531.5) J36(531.5,531.5) J37(570.87,531.5) J38(610.24,531.5) J39(649.61,531.5) J40(688.98,531.5) J41(728.35,531.5) J42(767.72,531.5) J43(807.09,531.5) J44(846.46,531.5) K1(-846.46,492.13) K2(-807.09,492.13) K3(-767.72,492.13) K4(-728.35,492.13) K5(-688.98,492.13) K6(-649.61,492.13) K7(-610.24,492.13) K8(-570.87,492.13) K9(-531.5,492.13) K10(-492.13,492.13) K11(-452.76,492.13) K12(-413.39,492.13) K13(-374.02,492.13) K14(-334.65,492.13) K15(-295.28,492.13) K16(-255.91,492.13) K17(-216.54,492.13) K18(-177.17,492.13) K19(-137.8,492.13) K20(-98.43,492.13) K21(-59.06,492.13) K22(-19.69,492.13) K23(19.69,492.13) K24(59.06,492.13) K25(98.43,492.13) K26(137.8,492.13) K27(177.17,492.13) K28(216.54,492.13) K29(255.91,492.13) K30(295.28,492.13) K31(334.65,492.13) K32(374.02,492.13) K33(413.39,492.13) K34(452.76,492.13) K35(492.13,492.13) K36(531.5,492.13) K37(570.87,492.13) K38(610.24,492.13) K39(649.61,492.13) K40(688.98,492.13) K41(728.35,492.13) K42(767.72,492.13) K43(807.09,492.13) K44(846.46,492.13) L1(-846.46,452.76) L2(-807.09,452.76) L3(-767.72,452.76) L4(-728.35,452.76) L5(-688.98,452.76) L6(-649.61,452.76) L7(-610.24,452.76) L8(-570.87,452.76) L9(-531.5,452.76) L10(-492.13,452.76) L11(-452.76,452.76) L12(-413.39,452.76) L13(-374.02,452.76) L14(-334.65,452.76) L15(-295.28,452.76) L16(-255.91,452.76) L17(-216.54,452.76) L18(-177.17,452.76) L19(-137.8,452.76) L20(-98.43,452.76) L21(-59.06,452.76) L22(-19.69,452.76) L23(19.69,452.76) L24(59.06,452.76) L25(98.43,452.76) L26(137.8,452.76) L27(177.17,452.76) L28(216.54,452.76) L29(255.91,452.76) L30(295.28,452.76) L31(334.65,452.76) L32(374.02,452.76) L33(413.39,452.76) L34(452.76,452.76) L35(492.13,452.76) L36(531.5,452.76) L37(570.87,452.76) L38(610.24,452.76) L39(649.61,452.76) L40(688.98,452.76) L41(728.35,452.76) L42(767.72,452.76) L43(807.09,452.76) L44(846.46,452.76) M1(-846.46,413.39) M2(-807.09,413.39) M3(-767.72,413.39) M4(-728.35,413.39) M5(-688.98,413.39) M6(-649.61,413.39) M7(-610.24,413.39) M8(-570.87,413.39) M9(-531.5,413.39) M10(-492.13,413.39) M11(-452.76,413.39) M12(-413.39,413.39) M13(-374.02,413.39) M14(-334.65,413.39) M15(-295.28,413.39) M16(-255.91,413.39) M17(-216.54,413.39) M18(-177.17,413.39) M19(-137.8,413.39) M20(-98.43,413.39) M21(-59.06,413.39) M22(-19.69,413.39) M23(19.69,413.39) M24(59.06,413.39) M25(98.43,413.39) M26(137.8,413.39) M27(177.17,413.39) M28(216.54,413.39) M29(255.91,413.39) M30(295.28,413.39) M31(334.65,413.39) M32(374.02,413.39) M33(413.39,413.39) M34(452.76,413.39) M35(492.13,413.39) M36(531.5,413.39) M37(570.87,413.39) M38(610.24,413.39) M39(649.61,413.39) M40(688.98,413.39) M41(728.35,413.39) M42(767.72,413.39) M43(807.09,413.39) M44(846.46,413.39) N1(-846.46,374.02) N2(-807.09,374.02) N3(-767.72,374.02) N4(-728.35,374.02) N5(-688.98,374.02) N6(-649.61,374.02) N7(-610.24,374.02) N8(-570.87,374.02) N9(-531.5,374.02) N10(-492.13,374.02) N11(-452.76,374.02) N12(-413.39,374.02) N13(-374.02,374.02) N14(-334.65,374.02) N15(-295.28,374.02) N16(-255.91,374.02) N17(-216.54,374.02) N18(-177.17,374.02) N19(-137.8,374.02) N20(-98.43,374.02) N21(-59.06,374.02) N22(-19.69,374.02) N23(19.69,374.02) N24(59.06,374.02) N25(98.43,374.02) N26(137.8,374.02) N27(177.17,374.02) N28(216.54,374.02) N29(255.91,374.02) N30(295.28,374.02) N31(334.65,374.02) N32(374.02,374.02) N33(413.39,374.02) N34(452.76,374.02) N35(492.13,374.02) N36(531.5,374.02) N37(570.87,374.02) N38(610.24,374.02) N39(649.61,374.02) N40(688.98,374.02) N41(728.35,374.02) N42(767.72,374.02) N43(807.09,374.02) N44(846.46,374.02) P1(-846.46,334.65) P2(-807.09,334.65) P3(-767.72,334.65) P4(-728.35,334.65) P5(-688.98,334.65) P6(-649.61,334.65) P7(-610.24,334.65) P8(-570.87,334.65) P9(-531.5,334.65) P10(-492.13,334.65) P11(-452.76,334.65) P12(-413.39,334.65) P13(-374.02,334.65) P14(-334.65,334.65) P15(-295.28,334.65) P16(-255.91,334.65) P17(-216.54,334.65) P18(-177.17,334.65) P19(-137.8,334.65) P20(-98.43,334.65) P21(-59.06,334.65) P22(-19.69,334.65) P23(19.69,334.65) P24(59.06,334.65) P25(98.43,334.65) P26(137.8,334.65) P27(177.17,334.65) P28(216.54,334.65) P29(255.91,334.65) P30(295.28,334.65) P31(334.65,334.65) P32(374.02,334.65) P33(413.39,334.65) P34(452.76,334.65) P35(492.13,334.65) P36(531.5,334.65) P37(570.87,334.65) P38(610.24,334.65) P39(649.61,334.65) P40(688.98,334.65) P41(728.35,334.65) P42(767.72,334.65) P43(807.09,334.65) P44(846.46,334.65) R1(-846.46,295.28) R2(-807.09,295.28) R3(-767.72,295.28) R4(-728.35,295.28) R5(-688.98,295.28) R6(-649.61,295.28) R7(-610.24,295.28) R8(-570.87,295.28) R9(-531.5,295.28) R10(-492.13,295.28) R11(-452.76,295.28) R12(-413.39,295.28) R13(-374.02,295.28) R14(-334.65,295.28) R15(-295.28,295.28) R16(-255.91,295.28) R17(-216.54,295.28) R18(-177.17,295.28) R19(-137.8,295.28) R20(-98.43,295.28) R21(-59.06,295.28) R22(-19.69,295.28) R23(19.69,295.28) R24(59.06,295.28) R25(98.43,295.28) R26(137.8,295.28) R27(177.17,295.28) R28(216.54,295.28) R29(255.91,295.28) R30(295.28,295.28) R31(334.65,295.28) R32(374.02,295.28) R33(413.39,295.28) R34(452.76,295.28) R35(492.13,295.28) R36(531.5,295.28) R37(570.87,295.28) R38(610.24,295.28) R39(649.61,295.28) R40(688.98,295.28) R41(728.35,295.28) R42(767.72,295.28) R43(807.09,295.28) R44(846.46,295.28) T1(-846.46,255.91) T2(-807.09,255.91) T3(-767.72,255.91) T4(-728.35,255.91) T5(-688.98,255.91) T6(-649.61,255.91) T7(-610.24,255.91) T8(-570.87,255.91) T9(-531.5,255.91) T10(-492.13,255.91) T11(-452.76,255.91) T12(-413.39,255.91) T13(-374.02,255.91) T14(-334.65,255.91) T15(-295.28,255.91) T16(-255.91,255.91) T17(-216.54,255.91) T18(-177.17,255.91) T19(-137.8,255.91) T20(-98.43,255.91) T21(-59.06,255.91) T22(-19.69,255.91) T23(19.69,255.91) T24(59.06,255.91) T25(98.43,255.91) T26(137.8,255.91) T27(177.17,255.91) T28(216.54,255.91) T29(255.91,255.91) T30(295.28,255.91) T31(334.65,255.91) T32(374.02,255.91) T33(413.39,255.91) T34(452.76,255.91) T35(492.13,255.91) T36(531.5,255.91) T37(570.87,255.91) T38(610.24,255.91) T39(649.61,255.91) T40(688.98,255.91) T41(728.35,255.91) T42(767.72,255.91) T43(807.09,255.91) T44(846.46,255.91) U1(-846.46,216.54) U2(-807.09,216.54) U3(-767.72,216.54) U4(-728.35,216.54) U5(-688.98,216.54) U6(-649.61,216.54) U7(-610.24,216.54) U8(-570.87,216.54) U9(-531.5,216.54) U10(-492.13,216.54) U11(-452.76,216.54) U12(-413.39,216.54) U13(-374.02,216.54) U14(-334.65,216.54) U15(-295.28,216.54) U16(-255.91,216.54) U17(-216.54,216.54) U18(-177.17,216.54) U19(-137.8,216.54) U20(-98.43,216.54) U21(-59.06,216.54) U22(-19.69,216.54) U23(19.69,216.54) U24(59.06,216.54) U25(98.43,216.54) U26(137.8,216.54) U27(177.17,216.54) U28(216.54,216.54) U29(255.91,216.54) U30(295.28,216.54) U31(334.65,216.54) U32(374.02,216.54) U33(413.39,216.54) U34(452.76,216.54) U35(492.13,216.54) U36(531.5,216.54) U37(570.87,216.54) U38(610.24,216.54) U39(649.61,216.54) U40(688.98,216.54) U41(728.35,216.54) U42(767.72,216.54) U43(807.09,216.54) U44(846.46,216.54) V1(-846.46,177.17) V2(-807.09,177.17) V3(-767.72,177.17) V4(-728.35,177.17) V5(-688.98,177.17) V6(-649.61,177.17) V7(-610.24,177.17) V8(-570.87,177.17) V9(-531.5,177.17) V10(-492.13,177.17) V11(-452.76,177.17) V12(-413.39,177.17) V13(-374.02,177.17) V14(-334.65,177.17) V15(-295.28,177.17) V16(-255.91,177.17) V17(-216.54,177.17) V18(-177.17,177.17) V19(-137.8,177.17) V20(-98.43,177.17) V21(-59.06,177.17) V22(-19.69,177.17) V23(19.69,177.17) V24(59.06,177.17) V25(98.43,177.17) V26(137.8,177.17) V27(177.17,177.17) V28(216.54,177.17) V29(255.91,177.17) V30(295.28,177.17) V31(334.65,177.17) V32(374.02,177.17) V33(413.39,177.17) V34(452.76,177.17) V35(492.13,177.17) V36(531.5,177.17) V37(570.87,177.17) V38(610.24,177.17) V39(649.61,177.17) V40(688.98,177.17) V41(728.35,177.17) V42(767.72,177.17) V43(807.09,177.17) V44(846.46,177.17) W1(-846.46,137.8) W2(-807.09,137.8) W3(-767.72,137.8) W4(-728.35,137.8) W5(-688.98,137.8) W6(-649.61,137.8) W7(-610.24,137.8) W8(-570.87,137.8) W9(-531.5,137.8) W10(-492.13,137.8) W11(-452.76,137.8) W12(-413.39,137.8) W13(-374.02,137.8) W14(-334.65,137.8) W15(-295.28,137.8) W16(-255.91,137.8) W17(-216.54,137.8) W18(-177.17,137.8) W19(-137.8,137.8) W20(-98.43,137.8) W21(-59.06,137.8) W22(-19.69,137.8) W23(19.69,137.8) W24(59.06,137.8) W25(98.43,137.8) W26(137.8,137.8) W27(177.17,137.8) W28(216.54,137.8) W29(255.91,137.8) W30(295.28,137.8) W31(334.65,137.8) W32(374.02,137.8) W33(413.39,137.8) W34(452.76,137.8) W35(492.13,137.8) W36(531.5,137.8) W37(570.87,137.8) W38(610.24,137.8) W39(649.61,137.8) W40(688.98,137.8) W41(728.35,137.8) W42(767.72,137.8) W43(807.09,137.8) W44(846.46,137.8) Y1(-846.46,98.43) Y2(-807.09,98.43) Y3(-767.72,98.43) Y4(-728.35,98.43) Y5(-688.98,98.43) Y6(-649.61,98.43) Y7(-610.24,98.43) Y8(-570.87,98.43) Y9(-531.5,98.43) Y10(-492.13,98.43) Y11(-452.76,98.43) Y12(-413.39,98.43) Y13(-374.02,98.43) Y14(-334.65,98.43) Y15(-295.28,98.43) Y16(-255.91,98.43) Y17(-216.54,98.43) Y18(-177.17,98.43) Y19(-137.8,98.43) Y20(-98.43,98.43) Y21(-59.06,98.43) Y22(-19.69,98.43) Y23(19.69,98.43) Y24(59.06,98.43) Y25(98.43,98.43) Y26(137.8,98.43) Y27(177.17,98.43) Y28(216.54,98.43) Y29(255.91,98.43) Y30(295.28,98.43) Y31(334.65,98.43) Y32(374.02,98.43) Y33(413.39,98.43) Y34(452.76,98.43) Y35(492.13,98.43) Y36(531.5,98.43) Y37(570.87,98.43) Y38(610.24,98.43) Y39(649.61,98.43) Y40(688.98,98.43) Y41(728.35,98.43) Y42(767.72,98.43) Y43(807.09,98.43) Y44(846.46,98.43)
Top Overlay:
  lines w8: -881.83,846.46 -881.83,881.83 -846.46,881.83 ; -881.83,846.46 -881.83,-881.83 881.83,-881.83 881.83,881.83 -846.46,881.83 ; -881.83,846.46 -846.46,881.83
Top Solder:
  drawing of 1932 lines, arcs and shapes, not listed